# Altium footprint library CONNECTOR.PcbLib: 169 footprints (part 8 of 11)
Each footprint in its own frame and in the unit in brackets; x right, y up, seen from the top. Pads: shape width x height; smd on the part's side, far side on the other; paste and mask are expansions set on the pad; w line width, h text height; cw(c..) or ccw(c..) is an arc to the next point about the centre after c.
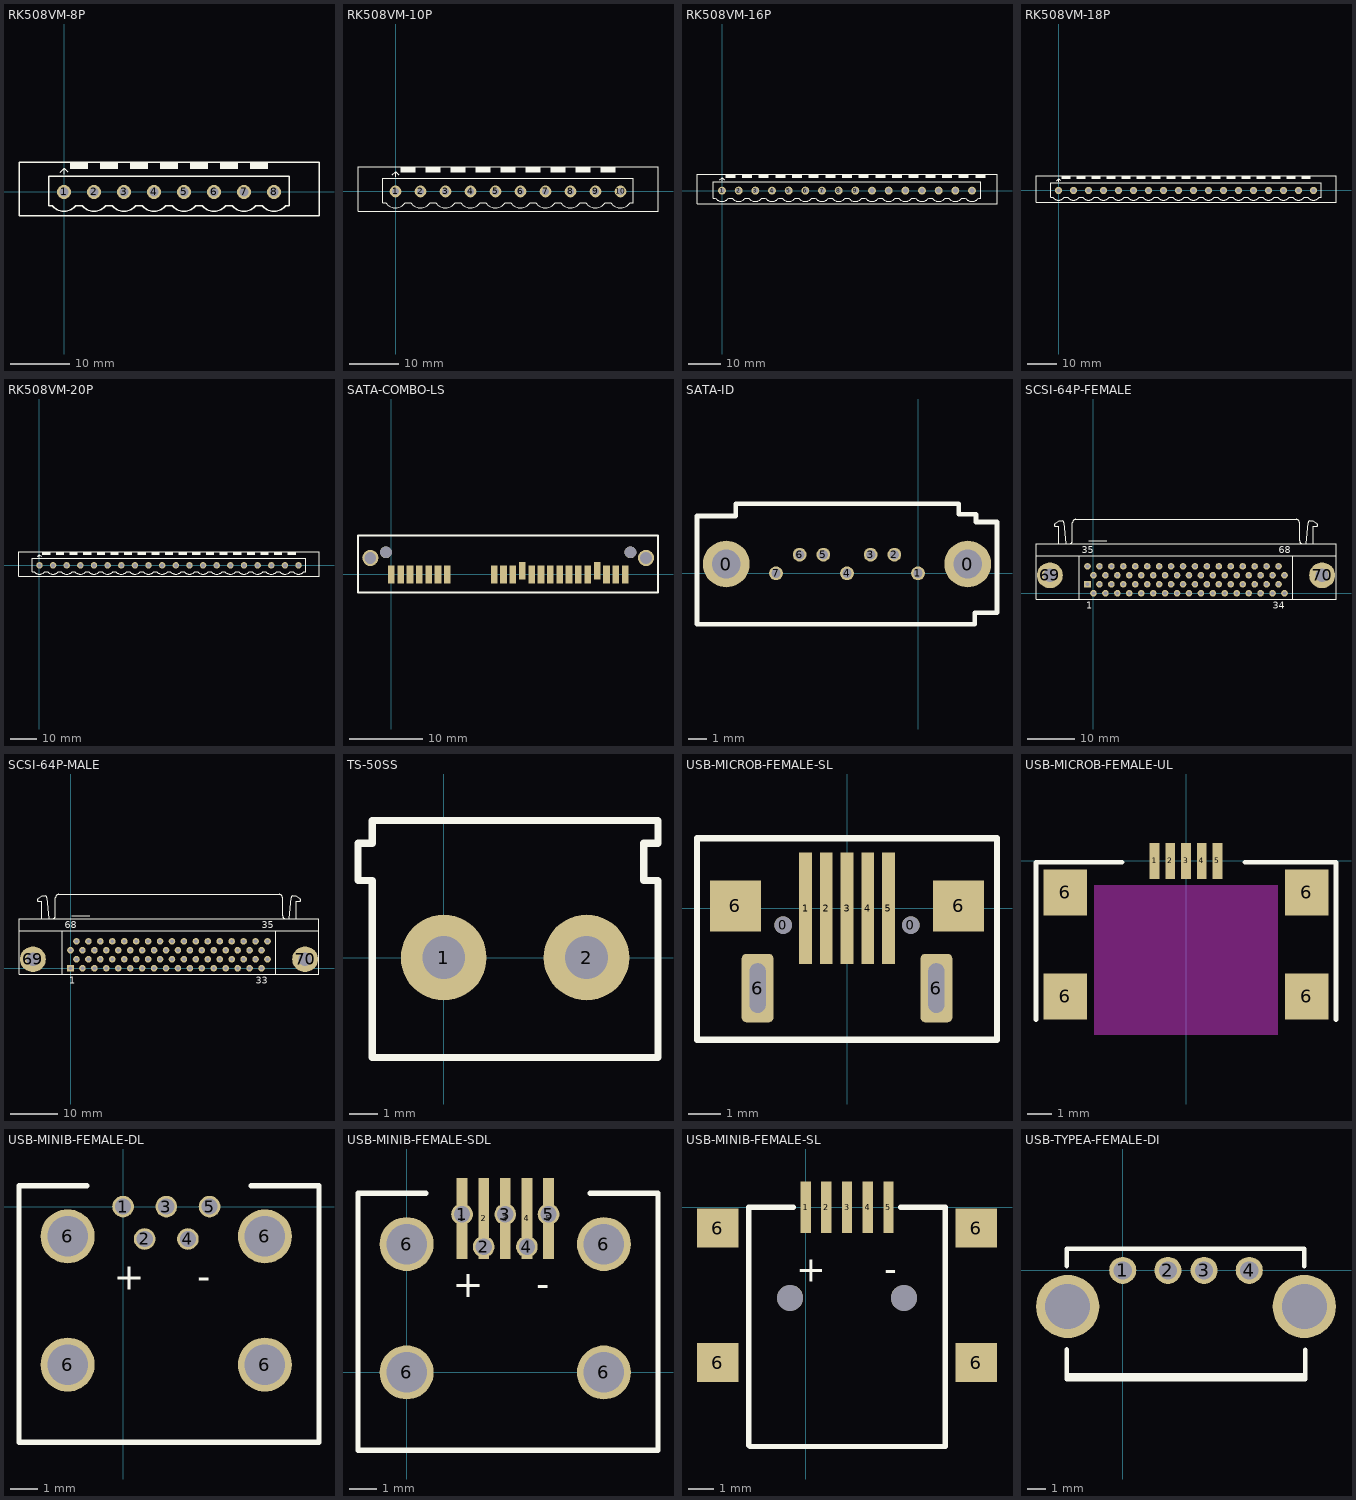
[diagram p7: the footprints below, top view; thin cyan lines are the x and y axes]

## RK508VM-8P [mm]
height 12
pads (8):
  round 2.4 hole 1.5: 1(0,0) 2(5.08,0) 3(10.16,0) 4(15.24,0) 5(20.32,0) 6(25.4,0) 7(30.48,0) 8(35.56,0)
Top Overlay:
  rectangle: 31.52,3.9 34.56,4.9
  rectangle: 26.44,3.9 29.48,4.9
  rectangle: 21.36,3.9 24.4,4.9
  rectangle: 16.28,3.9 19.32,4.9
  rectangle: 11.2,3.9 14.24,4.9
  rectangle: 6.12,3.9 9.16,4.9
  rectangle: 1.04,3.9 4.08,4.9
  lines w0.2: -0.63,3.37 0,4 ; 0,3 0,4 ; 0.61,3.39 0,4
  lines w0.25: 1.997,-2.297 cw(c-0.002,-0.797) -2,-2.3 -2.6,-2.3 -2.6,2.7 38.16,2.7 38.16,-2.3 37.56,-2.3 ; 2,-2.3 3.08,-2.3 ccw(c5.078,-0.797) 7.077,-2.297 ; 7.08,-2.3 8.16,-2.3 ccw(c10.158,-0.797) 12.157,-2.297 ; 12.16,-2.3 13.24,-2.3 ccw(c15.238,-0.797) 17.237,-2.297 ; 17.24,-2.3 18.32,-2.3 ccw(c20.318,-0.797) 22.317,-2.297 ; 22.32,-2.3 23.4,-2.3 ccw(c25.398,-0.797) 27.397,-2.297 ; 27.4,-2.3 28.48,-2.3 ccw(c30.478,-0.797) 32.477,-2.297 ; 32.48,-2.3 33.56,-2.3 ccw(c35.558,-0.797) 37.557,-2.297 ; -7.62,-4 43.18,-4 43.18,5 -7.62,5 -7.62,-4

## RK508VM-10P [mm]
height 12
pads (10):
  round 2.4 hole 1.5: 1(0,0) 2(5.08,0) 3(10.16,0) 4(15.24,0) 5(20.32,0) 6(25.4,0) 7(30.48,0) 8(35.56,0) 9(40.64,0) 10(45.72,0)
Top Overlay:
  rectangle: 41.68,3.9 44.72,4.9
  rectangle: 36.6,3.9 39.64,4.9
  rectangle: 1.04,3.9 4.08,4.9
  rectangle: 6.12,3.9 9.16,4.9
  rectangle: 11.2,3.9 14.24,4.9
  rectangle: 16.28,3.9 19.32,4.9
  rectangle: 21.36,3.9 24.4,4.9
  rectangle: 26.44,3.9 29.48,4.9
  rectangle: 31.52,3.9 34.56,4.9
  lines w0.2: -0.63,3.37 0,4 ; 0,3 0,4 ; 0.61,3.39 0,4
  lines w0.25: 1.997,-2.297 cw(c-0.002,-0.797) -2,-2.3 -2.6,-2.3 -2.6,2.7 48.32,2.7 48.32,-2.3 47.72,-2.3 ; 2,-2.3 3.08,-2.3 ccw(c5.078,-0.797) 7.077,-2.297 ; 7.08,-2.3 8.16,-2.3 ccw(c10.158,-0.797) 12.157,-2.297 ; 12.16,-2.3 13.24,-2.3 ccw(c15.238,-0.797) 17.237,-2.297 ; 17.24,-2.3 18.32,-2.3 ccw(c20.318,-0.797) 22.317,-2.297 ; 22.32,-2.3 23.4,-2.3 ccw(c25.398,-0.797) 27.397,-2.297 ; 27.4,-2.3 28.48,-2.3 ccw(c30.478,-0.797) 32.477,-2.297 ; 32.48,-2.3 33.56,-2.3 ccw(c35.558,-0.797) 37.557,-2.297 ; 37.56,-2.3 38.64,-2.3 ccw(c40.638,-0.797) 42.637,-2.297 ; 42.64,-2.3 43.72,-2.3 ccw(c45.718,-0.797) 47.717,-2.297 ; -7.62,-4 -7.62,5 53.34,5 53.34,-4 -7.62,-4

## RK508VM-16P [mm]
height 12
pads (16):
  round 2.4 hole 1.5: 1(0,0) 2(5.08,0) 3(10.16,0) 4(15.24,0) 5(20.32,0) 6(25.4,0) 7(30.48,0) 8(35.56,0) 9(40.64,0) 10(45.72,0) 11(50.8,0) 12(55.88,0) 13(60.96,0) 14(66.04,0) 15(71.12,0) 16(76.2,0)
Top Overlay:
  rectangle: 67.08,3.9 70.12,4.9
  rectangle: 72.16,3.9 75.2,4.9
  rectangle: 77.24,3.9 80.28,4.9
  rectangle: 62,3.9 65.04,4.9
  rectangle: 56.92,3.9 59.96,4.9
  rectangle: 51.84,3.9 54.88,4.9
  rectangle: 46.76,3.9 49.8,4.9
  rectangle: 41.68,3.9 44.72,4.9
  rectangle: 36.6,3.9 39.64,4.9
  rectangle: 1.04,3.9 4.08,4.9
  rectangle: 6.12,3.9 9.16,4.9
  rectangle: 11.2,3.9 14.24,4.9
  rectangle: 16.28,3.9 19.32,4.9
  rectangle: 21.36,3.9 24.4,4.9
  rectangle: 26.44,3.9 29.48,4.9
  rectangle: 31.52,3.9 34.56,4.9
  lines w0.2: -0.63,3.37 0,4 ; 0,3 0,4 ; 0.61,3.39 0,4
  lines w0.25: 1.997,-2.297 cw(c-0.002,-0.797) -2,-2.3 -2.6,-2.3 -2.6,2.7 78.8,2.7 78.8,-2.3 78.2,-2.3 ; 2,-2.3 3.08,-2.3 ccw(c5.078,-0.797) 7.077,-2.297 ; 7.08,-2.3 8.16,-2.3 ccw(c10.158,-0.797) 12.157,-2.297 ; 12.16,-2.3 13.24,-2.3 ccw(c15.238,-0.797) 17.237,-2.297 ; 17.24,-2.3 18.32,-2.3 ccw(c20.318,-0.797) 22.317,-2.297 ; 22.32,-2.3 23.4,-2.3 ccw(c25.398,-0.797) 27.397,-2.297 ; 27.4,-2.3 28.48,-2.3 ccw(c30.478,-0.797) 32.477,-2.297 ; 37.56,-2.3 38.64,-2.3 ; 38.643,-2.303 ccw(c40.64,-0.8) 42.64,-2.3 43.72,-2.3 ccw(c45.718,-0.797) 47.717,-2.297 ; 47.72,-2.3 48.8,-2.3 ccw(c50.798,-0.797) 52.797,-2.297 ; 52.8,-2.3 53.88,-2.3 ccw(c55.878,-0.797) 57.877,-2.297 ; 57.88,-2.3 58.96,-2.3 ccw(c60.958,-0.797) 62.957,-2.297 ; 62.96,-2.3 64.04,-2.3 ccw(c66.038,-0.797) 68.037,-2.297 ; 68.04,-2.3 69.12,-2.3 ccw(c71.118,-0.797) 73.117,-2.297 ; 73.12,-2.3 74.2,-2.3 ; 33.56,-2.3 ccw(c35.558,-0.797) 37.557,-2.297 cw(c35.558,-0.797) 33.56,-2.3 ; 33.56,-2.3 32.48,-2.3 33.56,-2.3 ; 74.2,-2.3 ccw(c76.198,-0.797) 78.197,-2.297 cw(c76.198,-0.797) 74.2,-2.3 ; -7.62,-4 -7.62,5 83.82,5 83.82,-4 -7.62,-4

## RK508VM-18P [mm]
height 12
pads (18):
  round 2.4 hole 1.5: 1(0,0) 2(5.08,0) 3(10.16,0) 4(15.24,0) 5(20.32,0) 6(25.4,0) 7(30.48,0) 8(35.56,0) 9(40.64,0) 10(45.72,0) 11(50.8,0) 12(55.88,0) 13(60.96,0) 14(66.04,0) 15(71.12,0) 16(76.2,0) 17(81.28,0) 18(86.36,0)
Top Overlay:
  rectangle: 67.08,3.9 70.12,4.9
  rectangle: 72.16,3.9 75.2,4.9
  rectangle: 62,3.9 65.04,4.9
  rectangle: 56.92,3.9 59.96,4.9
  rectangle: 51.84,3.9 54.88,4.9
  rectangle: 46.76,3.9 49.8,4.9
  rectangle: 41.68,3.9 44.72,4.9
  rectangle: 36.6,3.9 39.64,4.9
  rectangle: 1.04,3.9 4.08,4.9
  rectangle: 6.12,3.9 9.16,4.9
  rectangle: 11.2,3.9 14.24,4.9
  rectangle: 16.28,3.9 19.32,4.9
  rectangle: 21.36,3.9 24.4,4.9
  rectangle: 26.44,3.9 29.48,4.9
  rectangle: 31.52,3.9 34.56,4.9
  rectangle: 82.32,3.9 85.36,4.9
  rectangle: 77.24,3.9 80.28,4.9
  lines w0.2: -0.63,3.37 0,4 ; 0,3 0,4 ; 0.61,3.39 0,4
  lines w0.25: 1.997,-2.297 cw(c-0.002,-0.797) -2,-2.3 -2.6,-2.3 -2.6,2.7 88.96,2.7 88.96,-2.3 88.36,-2.3 ; 2,-2.3 3.08,-2.3 ccw(c5.078,-0.797) 7.077,-2.297 ; 7.08,-2.3 8.16,-2.3 ccw(c10.158,-0.797) 12.157,-2.297 ; 12.16,-2.3 13.24,-2.3 ccw(c15.238,-0.797) 17.237,-2.297 ; 17.24,-2.3 18.32,-2.3 ccw(c20.318,-0.797) 22.317,-2.297 ; 22.32,-2.3 23.4,-2.3 ccw(c25.398,-0.797) 27.397,-2.297 ; 27.4,-2.3 28.48,-2.3 ccw(c30.478,-0.797) 32.477,-2.297 ; 37.56,-2.3 38.64,-2.3 ; 38.643,-2.303 ccw(c40.64,-0.8) 42.64,-2.3 43.72,-2.3 ccw(c45.718,-0.797) 47.717,-2.297 ; 47.72,-2.3 48.8,-2.3 ccw(c50.798,-0.797) 52.797,-2.297 ; 52.8,-2.3 53.88,-2.3 ccw(c55.878,-0.797) 57.877,-2.297 ; 57.88,-2.3 58.96,-2.3 ccw(c60.958,-0.797) 62.957,-2.297 ; 62.96,-2.3 64.04,-2.3 ccw(c66.038,-0.797) 68.037,-2.297 ; 68.04,-2.3 69.12,-2.3 ccw(c71.118,-0.797) 73.117,-2.297 ; 73.12,-2.3 74.2,-2.3 ccw(c76.198,-0.797) 78.197,-2.297 ; 78.2,-2.3 79.28,-2.3 ccw(c81.278,-0.797) 83.277,-2.297 ; 83.28,-2.3 84.36,-2.3 ccw(c86.358,-0.797) 88.357,-2.297 ; 33.56,-2.3 ccw(c35.558,-0.797) 37.557,-2.297 cw(c35.558,-0.797) 33.56,-2.3 ; 33.56,-2.3 32.48,-2.3 33.56,-2.3 ; -7.62,-4 -7.62,5 93.98,5 93.98,-4 -7.62,-4

## RK508VM-20P [mm]
height 12
pads (20):
  round 2.4 hole 1.5: 1(0,0) 2(5.08,0) 3(10.16,0) 4(15.24,0) 5(20.32,0) 6(25.4,0) 7(30.48,0) 8(35.56,0) 9(40.64,0) 10(45.72,0) 11(50.8,0) 12(55.88,0) 13(60.96,0) 14(66.04,0) 15(71.12,0) 16(76.2,0) 17(81.28,0) 18(86.36,0) 19(91.44,0) 20(96.52,0)
Top Overlay:
  rectangle: 87.4,3.9 90.44,4.9
  rectangle: 92.48,3.9 95.52,4.9
  rectangle: 67.08,3.9 70.12,4.9
  rectangle: 72.16,3.9 75.2,4.9
  rectangle: 62,3.9 65.04,4.9
  rectangle: 56.92,3.9 59.96,4.9
  rectangle: 51.84,3.9 54.88,4.9
  rectangle: 46.76,3.9 49.8,4.9
  rectangle: 41.68,3.9 44.72,4.9
  rectangle: 36.6,3.9 39.64,4.9
  rectangle: 1.04,3.9 4.08,4.9
  rectangle: 6.12,3.9 9.16,4.9
  rectangle: 11.2,3.9 14.24,4.9
  rectangle: 16.28,3.9 19.32,4.9
  rectangle: 21.36,3.9 24.4,4.9
  rectangle: 26.44,3.9 29.48,4.9
  rectangle: 31.52,3.9 34.56,4.9
  rectangle: 82.32,3.9 85.36,4.9
  rectangle: 77.24,3.9 80.28,4.9
  lines w0.2: -0.63,3.37 0,4 ; 0,3 0,4 ; 0.61,3.39 0,4
  lines w0.25: 1.997,-2.297 cw(c-0.002,-0.797) -2,-2.3 -2.6,-2.3 -2.6,2.7 99.12,2.7 99.12,-2.3 98.52,-2.3 ; 2,-2.3 3.08,-2.3 ccw(c5.078,-0.797) 7.077,-2.297 ; 7.08,-2.3 8.16,-2.3 ccw(c10.158,-0.797) 12.157,-2.297 ; 12.16,-2.3 13.24,-2.3 ccw(c15.238,-0.797) 17.237,-2.297 ; 17.24,-2.3 18.32,-2.3 ccw(c20.318,-0.797) 22.317,-2.297 ; 22.32,-2.3 23.4,-2.3 ccw(c25.398,-0.797) 27.397,-2.297 ; 27.4,-2.3 28.48,-2.3 ccw(c30.478,-0.797) 32.477,-2.297 ; 37.56,-2.3 38.64,-2.3 ; 38.643,-2.303 ccw(c40.64,-0.8) 42.64,-2.3 43.72,-2.3 ccw(c45.718,-0.797) 47.717,-2.297 ; 47.72,-2.3 48.8,-2.3 ccw(c50.798,-0.797) 52.797,-2.297 ; 52.8,-2.3 53.88,-2.3 ccw(c55.878,-0.797) 57.877,-2.297 ; 57.88,-2.3 58.96,-2.3 ccw(c60.958,-0.797) 62.957,-2.297 ; 62.96,-2.3 64.04,-2.3 ccw(c66.038,-0.797) 68.037,-2.297 ; 68.04,-2.3 69.12,-2.3 ccw(c71.118,-0.797) 73.117,-2.297 ; 73.12,-2.3 74.2,-2.3 ccw(c76.198,-0.797) 78.197,-2.297 ; 78.2,-2.3 79.28,-2.3 ccw(c81.278,-0.797) 83.277,-2.297 ; 83.28,-2.3 84.36,-2.3 ccw(c86.358,-0.797) 88.357,-2.297 ; 88.36,-2.3 89.44,-2.3 ccw(c91.438,-0.797) 93.437,-2.297 ; 93.44,-2.3 94.52,-2.3 ccw(c96.518,-0.797) 98.517,-2.297 ; 33.56,-2.3 ccw(c35.558,-0.797) 37.557,-2.297 cw(c35.558,-0.797) 33.56,-2.3 ; 33.56,-2.3 32.48,-2.3 33.56,-2.3 ; -7.62,-4 -7.62,5 104.14,5 104.14,-4 -7.62,-4

## SATA-COMBO-LS [mm]
pads (26):
  rect 0.9x2.4 smd: 1(0,0) 2(1.27,0) 3(2.54,0) 4(3.81,0) 5(5.08,0) 6(6.35,0) 7(7.62,0) 8(13.97,0) 9(15.24,0) 10(16.51,0) 11(17.78,0.5) 12(19.05,0) 13(20.32,0) 14(21.59,0) 15(22.86,0) 16(24.13,0) 17(25.4,0) 18(26.67,0) 19(27.94,0.5) 20(29.21,0) 21(30.48,0) 22(31.75,0)
  round 2.2 hole 1.6: ""(-2.84,2.24) ""(34.58,2.24)
  round 1.6 hole 1.6 unplated: ""(-0.725,3) ""(32.465,3)
Top Overlay:
  lines w0.254: -4.515,-2.46 -4.515,5.291 36.205,5.291 36.205,-2.46 -4.515,-2.46
3D body "5622-1200-ml-01.stp": height 6.75, standoff -2.46, extent -4.36,-0.63 36.07,12.248

## SATA-ID [mm]
pads (9):
  round 2.5 hole 1.55: 0(-10.291,0.5) 0(2.669,0.5)
  round 0.74 hole 0.5: 1(-0.001,0) 2(-1.271,1) 3(-2.541,1) 4(-3.811,0) 5(-5.081,1) 6(-6.351,1) 7(-7.621,0)
Top Overlay:
  lines w0.254: -11.861,3.07 -11.861,-2.74 3.049,-2.74 3.049,-2.12 4.209,-2.12 ; -11.831,3.07 -9.781,3.07 -9.781,3.7 ; -9.781,3.74 2.189,3.74 ; 2.189,3.68 2.189,3.17 3.109,3.17 3.109,2.75 4.209,2.75 ; 4.239,-2.12 4.239,2.75

## SCSI-64P-FEMALE [mm]
pads (70):
  rect 1.4x1.4 hole 0.8: 1(-1.267,1.904)
  round 1.4 hole 0.8: 2(0.003,-0.001) 3(1.273,1.904) 4(2.543,-0.001) 5(3.813,1.904) 6(5.083,-0.001) 7(6.353,1.904) 8(7.623,-0.001) 9(8.893,1.904) 10(10.163,-0.001) 11(11.433,1.904) 12(12.703,-0.001) 13(13.973,1.904) 14(15.243,-0.001) 15(16.513,1.904) 16(17.783,-0.001) 17(19.053,1.904) 18(20.323,-0.001) 19(21.593,1.904) 20(22.863,-0.001) 21(24.133,1.904) 22(25.403,-0.001) 23(26.673,1.904) 24(27.943,-0.001) 25(29.213,1.904) 26(30.483,-0.001) 27(31.753,1.904) 28(33.023,-0.001) 29(34.293,1.904) 30(35.563,-0.001) 31(36.833,1.904) 32(38.103,-0.001) 33(39.373,1.904) 34(40.643,-0.001) 35(-1.267,5.714) 36(0.003,3.809) 37(1.273,5.714) 38(2.543,3.809) 39(3.813,5.714) 40(5.083,3.809) 41(6.353,5.714) 42(7.623,3.809) 43(8.893,5.714) 44(10.163,3.809) 45(11.433,5.714) 46(12.703,3.809) 47(13.973,5.714) 48(15.243,3.809) 49(16.513,5.714) 50(17.783,3.809) 51(19.053,5.714) 52(20.323,3.809) 53(21.593,5.714) 54(22.863,3.809) 55(24.133,5.714) 56(25.403,3.809) 57(26.673,5.714) 58(27.943,3.809) 59(29.213,5.714) 60(30.483,3.809) 61(31.753,5.714) 62(33.023,3.809) 63(34.293,5.714) 64(35.563,3.809) 65(36.833,5.714) 66(38.103,3.809) 67(39.373,5.714) 68(40.643,3.809)
  round 5.5 hole 2.8: 69(-9.277,3.809) 70(48.653,3.809)
Top Overlay:
  lines w0.2: -12.227,7.999 51.603,7.999 ; -8.242,14.769 -7.302,15.397 -6.579,15.397 cw(c-6.682,14.999) -6.271,14.999 ; -8.228,14.754 ccw(c-8.002,14.509) -8.252,14.289 -7.372,14.289 -7.372,10.499 ; -6.272,15.019 -5.902,10.499 ; -5.162,10.504 ccw(c-5.162,11.199) -4.467,11.199 -4.467,14.999 ; -4.462,15.004 cw(c-3.767,15.004) -3.767,15.699 43.143,15.699 cw(c43.143,15.004) 43.838,15.004 ; -3.027,-1.301 -3.027,7.919 ; 42.403,-1.301 42.403,7.999 ; 43.843,14.999 43.843,11.199 ccw(c44.538,11.199) 44.538,10.504 ; 45.278,10.499 45.648,15.019 ; 45.648,14.999 cw(c46.058,14.999) 45.956,15.397 46.678,15.397 47.618,14.769 ; 46.748,10.499 46.748,14.289 47.628,14.289 ccw(c47.378,14.509) 47.604,14.754 ; -12.227,-1.301 -12.227,10.499 51.603,10.499 51.603,-1.301 -12.227,-1.301
  lines w0.254: -0.992,11.199 2.833,11.199
  text "68" at 39.393,8.474 h1.5
  text "35" at -2.517,8.474 h1.5
  text "34" at 38.123,-3.276 h1.5
  text "1" at -1.517,-3.276 h1.5

## SCSI-64P-MALE [mm]
pads (70):
  rect 1.4x1.4 hole 0.8: 1(-0.001,0)
  round 1.4 hole 0.8: 2(1.269,1.905) 3(2.539,0) 4(3.809,1.905) 5(5.079,0) 6(6.349,1.905) 7(7.619,0) 8(8.889,1.905) 9(10.159,0) 10(11.429,1.905) 11(12.699,0) 12(13.969,1.905) 13(15.239,0) 14(16.509,1.905) 15(17.779,0) 16(19.049,1.905) 17(20.319,0) 18(21.589,1.905) 19(22.859,0) 20(24.129,1.905) 21(25.399,0) 22(26.669,1.905) 23(27.939,0) 24(29.209,1.905) 25(30.479,0) 26(31.749,1.905) 27(33.019,0) 28(34.289,1.905) 29(35.559,0) 30(36.829,1.905) 31(38.099,0) 32(39.369,1.905) 33(40.639,0) 34(41.909,1.905) 35(41.909,5.715) 36(40.639,3.81) 37(39.369,5.715) 38(38.099,3.81) 39(36.829,5.715) 40(35.559,3.81) 41(34.289,5.715) 42(33.019,3.81) 43(31.749,5.715) 44(30.479,3.81) 45(29.209,5.715) 46(27.939,3.81) 47(26.669,5.715) 48(25.399,3.81) 49(24.129,5.715) 50(22.859,3.81) 51(21.589,5.715) 52(20.319,3.81) 53(19.049,5.715) 54(17.779,3.81) 55(16.509,5.715) 56(15.239,3.81) 57(13.969,5.715) 58(12.699,3.81) 59(11.429,5.715) 60(10.159,3.81) 61(8.889,5.715) 62(7.619,3.81) 63(6.349,5.715) 64(5.079,3.81) 65(3.809,5.715) 66(2.539,3.81) 67(1.269,5.715) 68(-0.001,3.81)
  round 5.5 hole 2.8: 69(-8.01,1.905) 70(49.919,1.905)
Top Overlay:
  lines w0.2: -10.96,8 52.869,8 ; -6.975,14.77 -6.036,15.397 -5.313,15.397 cw(c-5.416,15) -5.005,15 ; -6.961,14.755 ccw(c-6.736,14.51) -6.986,14.29 -6.105,14.29 -6.105,10.5 ; -5.005,15.02 -4.635,10.5 ; -3.895,10.505 ccw(c-3.895,11.2) -3.2,11.2 -3.2,15 ; -3.195,15.005 cw(c-2.5,15.005) -2.5,15.7 44.409,15.7 cw(c44.409,15.005) 45.104,15.005 ; -1.76,-1.3 -1.76,7.92 ; 43.669,-1.3 43.669,8 ; 45.109,15 45.109,11.2 ccw(c45.804,11.2) 45.804,10.505 ; 46.544,10.5 46.914,15.02 ; 46.914,15 cw(c47.325,15) 47.222,15.397 47.944,15.397 48.884,14.77 ; 48.014,10.5 48.014,14.29 48.894,14.29 ccw(c48.644,14.51) 48.87,14.755 ; -10.96,-1.3 -10.96,10.5 52.869,10.5 52.869,-1.3 -10.96,-1.3
  lines w0.254: 0.275,11.2 4.099,11.2
  text "35" at 40.659,8.475 h1.5
  text "68" at -1.251,8.475 h1.5
  text "33" at 39.389,-3.275 h1.5
  text "1" at -0.25,-3.275 h1.5

## TS-50SS [mm]
height 11.5
pads (2):
  round 3 hole 1.5: 1(0,0) 2(5,0)
Top Overlay:
  lines w0.254: -3,2.7 -3,4 -2.5,4 -2.5,4.8 7.5,4.8 7.5,4 7,4 7,2.7 7.5,2.7 7.5,-3.5 -2.5,-3.5 -2.5,2.7 -3,2.7

## USB-MICROB-FEMALE-SL [mm]
pads (11):
  round 0.55 hole 0.55: 0(-2,-0.525) 0(2,-0.525)
  rect 0.4x3.5 smd: 1(-1.3,0) 2(-0.65,0) 3(0,0) 4(0.65,0) 5(1.3,0)
  rect 1.6x1.6 smd: 6(-3.5,0.075) 6(3.5,0.075)
  rrect30% 1x2.15 hole 0.5 slot 1.55 at 90 deg paste+0: 6(-2.8,-2.5)
  rrect30% 1x2.15 hole 0.5 slot 1.55 at 90 deg: 6(2.8,-2.5)
Top Overlay:
  lines w0.2: -4.7,-4.125 -4.7,2.2 4.7,2.2 4.7,-4.125 -4.7,-4.125
3D body "User Library-usb_port_ch.STEP": height 2.82, standoff -0.75, extent -3.993,-5.108 4.007,0.492

## USB-MICROB-FEMALE-UL [mm]
pads (9):
  rect 0.4x1.5 smd: 1(-1.3,0) 2(-0.65,0) 3(0,0) 4(0.65,0) 5(1.3,0)
  rect 1.8x1.9 smd: 6(-5,-5.6) 6(-5,-1.3) 6(5,-5.6) 6(5,-1.3)
Top Overlay:
  lines w0.2: -6.2,-6.55 -6.2,-0.05 -2.64,-0.05 ; 2.44,-0.05 6.2,-0.05 6.2,-6.55
Keep-Out Layer:
  rectangle: -3.8,-7.2 3.8,-1

## USB-MINIB-FEMALE-DL [mm]
pads (9):
  round 0.8 hole 0.6: 1(0,0) 2(0.8,-1.2) 3(1.6,0) 4(2.4,-1.2) 5(3.2,0)
  round 2 hole 1.5: 6(-2.05,-5.85) 6(-2.05,-1.1) 6(5.25,-5.85) 6(5.25,-1.1)
Top Overlay:
  lines w0.2: -1.35,0.775 -3.85,0.775 -3.85,-8.725 7.25,-8.725 7.25,0.775 4.75,0.775
  text "-" at 2.75,-3.05 h1
  text "+" at -0.35,-3.075 h1

## USB-MINIB-FEMALE-SDL [mm]
pads (14):
  rect 0.4x3 smd: 1(2.05,5.699) 2(2.85,5.699) 3(3.65,5.699) 4(4.45,5.699) 5(5.25,5.699)
  round 0.8 hole 0.6: 1(2.05,5.849) 2(2.85,4.649) 3(3.65,5.849) 4(4.45,4.649) 5(5.25,5.849)
  round 2 hole 1.5: 6(0,-0.001) 6(0,4.749) 6(7.3,-0.001) 6(7.3,4.749)
Top Overlay:
  lines w0.2: 0.7,6.624 -1.8,6.624 -1.8,-2.876 9.3,-2.876 9.3,6.624 6.8,6.624
  text "-" at 4.8,2.799 h1
  text "+" at 1.7,2.774 h1

## USB-MINIB-FEMALE-SL [mm]
pads (11):
  rect 0.4x2 smd: 1(0,0) 2(0.8,0) 3(1.6,0) 4(2.4,0) 5(3.2,0)
  rect 1.6x1.5 smd: 6(-3.402,-6.001) 6(-3.402,-0.801) 6(6.598,-6.001) 6(6.598,-0.801)
  round 1 hole 1: ""(-0.6,-3.5) ""(3.8,-3.5)
Top Overlay:
  lines w0.2: -2.2,0 -2.2,-9.205 -2.154,-9.25 5.385,-9.25 ; -2.185,0 -0.469,0 ; 3.676,0 5.385,0 ; 5.4,-9.24 5.4,0
  text "+" at -0.356,-2.87 h1
  text "-" at 3.048,-2.87 h1
3D body "5887.stp": height 3.9, standoff -1.05, extent -3.35,-9.406 6.55,-0.406

## USB-TYPEA-FEMALE-DI [mm]
pads (6):
  round 1.5 hole 1: 1(0,0) 2(2.5,0) 3(4.5,0) 4(7,0)
  round 3.5 hole 2.5: ""(-3.05,-2) ""(10.05,-2)
Top Overlay:
  lines w0.254: -3.108,0.24 -3.108,1.2 10.05,1.2 ; -3.106,-6.026 -3.106,-4.38 ; -3.1,-6.03 10.1,-6.03 10.1,-4.384 ; -3,-5.8 10.07,-5.8 ; 10.049,0.225 10.049,1.185
3D body "14382.stp": height 15, standoff -2.99, extent -4.532,-5.33 11.452,2.31